# Altium footprint library Amirreza.PcbLib: 524 footprints (part 12 of 33)
Each footprint in its own frame and in the unit in brackets; x right, y up, seen from the top. Pads: shape width x height; smd on the part's side, far side on the other; paste and mask are expansions set on the pad; w line width, h text height; cw(c..) or ccw(c..) is an arc to the next point about the centre after c.
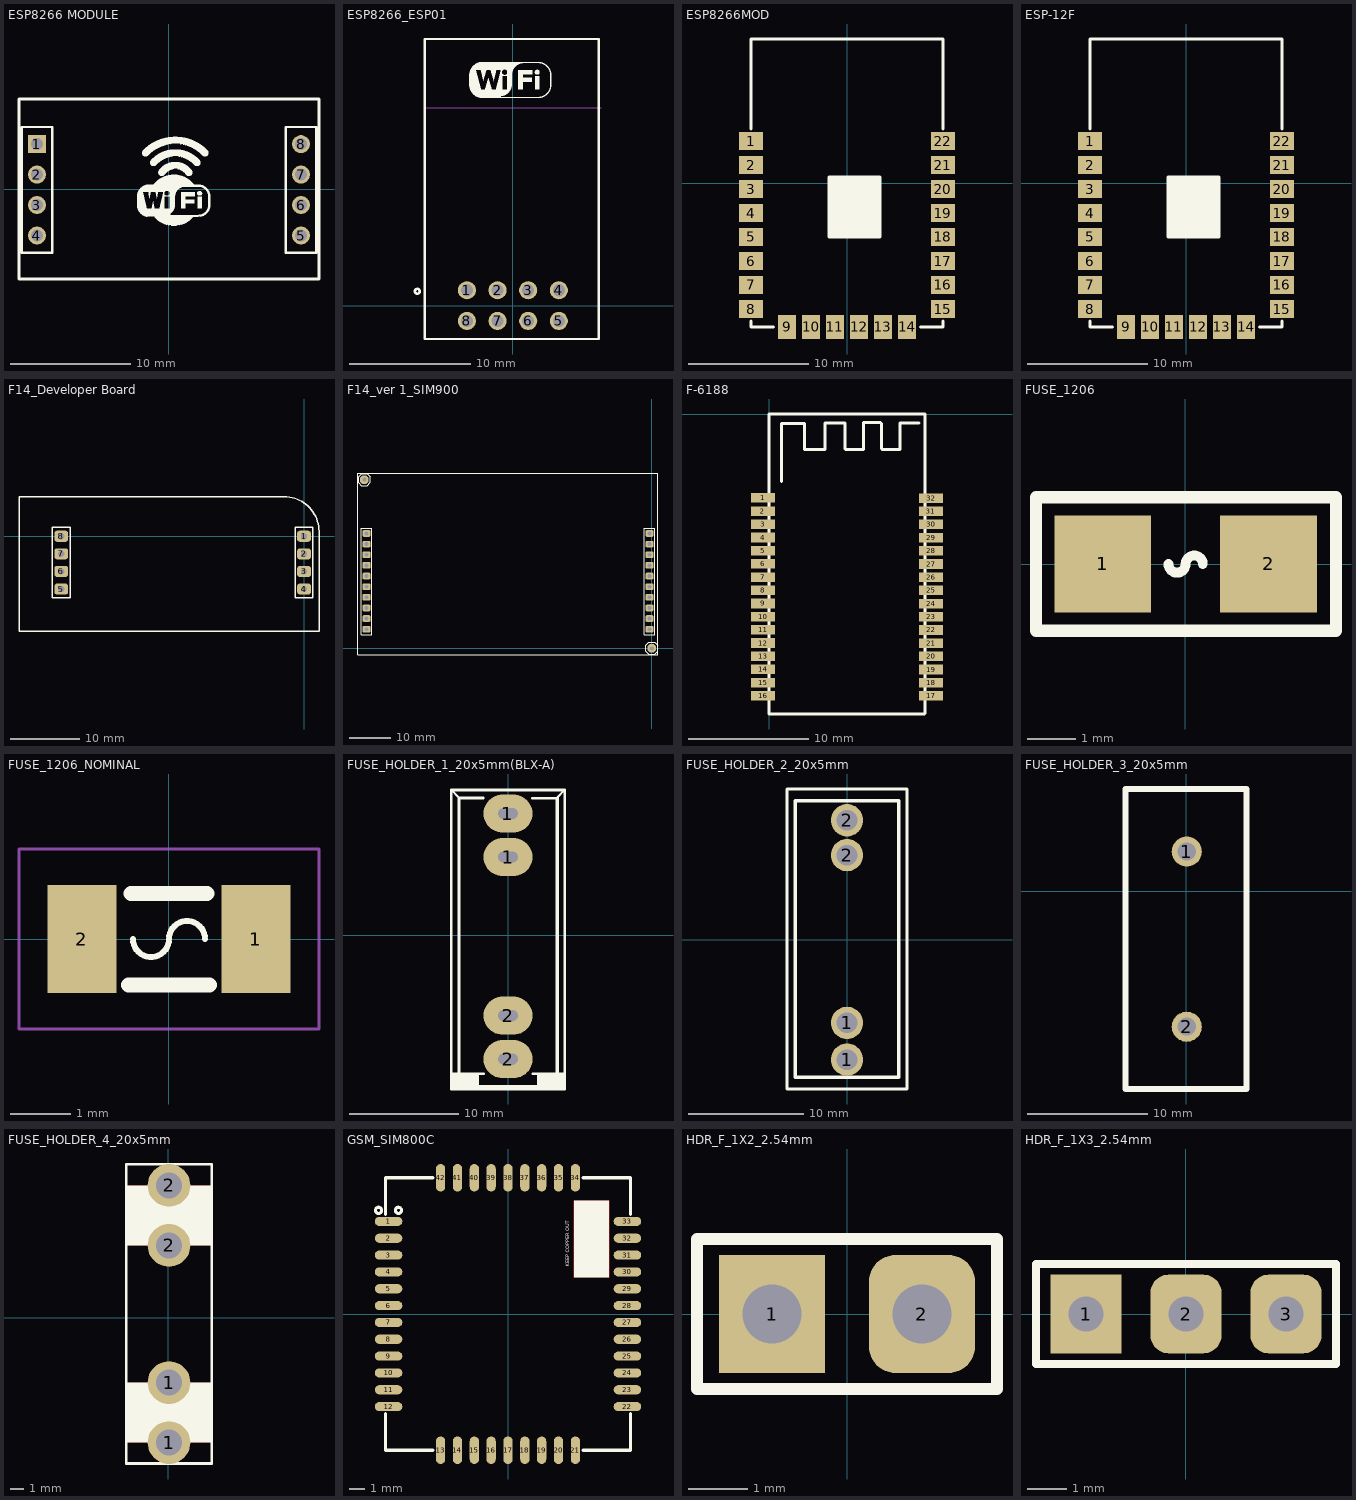
[diagram p11: the footprints below, top view; thin cyan lines are the x and y axes]

## ESP8266 MODULE [mm] "BasirAndishan.Co-Designe"
pads (8):
  rect 1.5x1.5 / inner rect 1.5x1.5 / far side rect 2.1x2.1 hole 1: 1(-10.997,3.75)
  round 1.5 / inner round 1.5 / far side round 2.1 hole 1: 2(-10.997,1.21) 3(-10.997,-1.33) 4(-10.997,-3.87) 5(11.003,-3.87) 6(11.003,-1.33) 7(11.003,1.21) 8(11.003,3.75)
Top Overlay:
  drawing of 20 lines, arcs and shapes, not listed
3D body "User Library-zl262-4s_p2-54_l10-66_w2-54_h8-5.step": height 8.55, standoff -2.95, extent -12.267,-5.39 -9.727,5.27
3D body "User Library-zl262-4s_p2-54_l10-66_w2-54_h8-5.step": height 8.55, standoff -2.95, extent 9.733,-5.39 12.273,5.27

## ESP8266_ESP01 [mm] "ESP8266 ESP-01_Ai-Thinker.Co"
pads (8):
  round 1.5 / inner round 1.5 / far side rect 2x2 hole 1: 1(-3.81,1.27)
  round 1.5 / inner round 1.5 / far side round 2 hole 1: 2(-1.27,1.27) 3(1.27,1.27) 4(3.81,1.27) 5(3.81,-1.27) 6(1.27,-1.27) 7(-1.27,-1.27) 8(-3.81,-1.27)
Top Overlay:
  drawing of 9 lines, arcs and shapes, not listed
Mechanical 13:
  lines w0.051: -7.289,16.406 7.315,16.406
3D body "User Library-Wi07C.STEP": height 5.8, standoff -5.88, extent -7.261,-2.749 7.239,22.051

## ESP8266MOD [mm]
pads (22):
  rect 2x1.5 smd: 1(-8,3.5) 2(-8,1.5) 3(-8,-0.5) 4(-8,-2.5) 5(-8,-4.5) 6(-8,-6.5) 7(-8,-8.5) 8(-8,-10.5) 15(8,-10.5) 16(8,-8.5) 17(8,-6.5) 18(8,-4.5) 19(8,-2.5) 20(8,-0.5) 21(8,1.5) 22(8,3.5)
  rect 1.5x2 smd: 9(-5,-12) 10(-3,-12) 11(-1,-12) 12(1,-12) 13(3,-12) 14(5,-12)
Top Overlay:
  region: 2.75,0.5 -1.5,0.5 -1.5,-4.5 2.75,-4.5
  lines w0.254: -8,-11.492 -8,-12 -6.111,-12 ; -8,4.51 -8,12 8,12 8,4.51 ; 6.111,-12 8,-12 8,-11.492 ; -1.5,-4.5 2.75,-4.5 2.75,0.5 -1.5,0.5 -1.5,-4.5
3D body "User Library-ESP_12_E.STEP": height 2.75, standoff 0.04, extent -8,-12 8,12

## ESP-12F [mm]
pads (22):
  rect 2x1.5 smd: 1(-8,3.5) 2(-8,1.5) 3(-8,-0.5) 4(-8,-2.5) 5(-8,-4.5) 6(-8,-6.5) 7(-8,-8.5) 8(-8,-10.5) 15(8,-10.5) 16(8,-8.5) 17(8,-6.5) 18(8,-4.5) 19(8,-2.5) 20(8,-0.5) 21(8,1.5) 22(8,3.5)
  rect 1.5x2 smd: 9(-5,-12) 10(-3,-12) 11(-1,-12) 12(1,-12) 13(3,-12) 14(5,-12)
Top Overlay:
  region: 2.75,0.5 -1.5,0.5 -1.5,-4.5 2.75,-4.5
  lines w0.254: -8,-11.492 -8,-12 -6.111,-12 ; -8,4.51 -8,12 8,12 8,4.51 ; 6.111,-12 8,-12 8,-11.492 ; -1.5,-4.5 2.75,-4.5 2.75,0.5 -1.5,0.5 -1.5,-4.5
3D body "User Library-ESP_12_E.STEP": height 2.75, standoff 0.04, extent -8,-12 8,12

## F14_Developer Board [mm]
pads (8):
  rrect50% 2x1.6 hole 0.9: 1(0,0) 2(0,-2.54) 3(0,-5.08) 4(0,-7.62) 5(-35.052,-7.62) 6(-35.052,-5.08) 7(-35.052,-2.54) 8(-35.052,0)
Top Overlay:
  lines w0.2: -41.148,-13.716 2.158,-13.716 2.158,0.703 ccw(c-2.842,0.703) -2.842,5.703 -41.148,5.703 -41.148,-13.716 ; -36.322,-8.89 -36.322,1.27 -33.782,1.27 -33.782,-8.89 -36.322,-8.89 ; -1.27,-8.89 -1.27,1.27 1.27,1.27 1.27,-8.89 -1.27,-8.89

## F14_ver 1_SIM900 [mm]
pads (22):
  rrect50% 2x1.6 hole 0.9: 1(-0.558,27.432) 2(-0.558,24.892) 3(-0.558,22.352) 4(-0.558,19.812) 5(-0.558,17.272) 6(-0.558,14.732) 7(-0.558,12.192) 8(-0.558,9.652) 9(-0.558,7.112) 10(-0.558,4.572) 11(-68.122,4.572) 12(-68.122,7.112) 13(-68.122,9.652) 14(-68.122,12.192) 15(-68.122,14.732) 16(-68.122,17.272) 17(-68.122,19.812) 18(-68.122,22.352) 19(-68.122,24.892) 20(-68.122,27.432)
  oct 2x2 hole 1: 10(-68.63,40.284) 10(0,0)
Top Overlay:
  lines w0.2: -70.03,39.58 -69.334,38.884 -67.974,38.884 -67.23,39.628 -67.23,40.98 -67.934,41.684 -69.315,41.684 -70.03,40.969 -70.03,39.58 ; -69.392,3.302 -66.852,3.302 -66.852,26.797 -66.852,28.702 -69.392,28.702 -69.392,3.302 ; -1.828,3.302 0.712,3.302 0.712,26.797 0.712,28.702 -1.828,28.702 -1.828,3.302 ; -1.4,-0.704 -0.704,-1.4 0.656,-1.4 1.4,-0.656 1.4,0.696 0.696,1.4 -0.685,1.4 -1.4,0.685 -1.4,-0.704
  lines w0.279: -70.154,-1.524 1.474,-1.524 1.474,41.808 -70.154,41.808 -70.154,-1.524
Bottom Overlay:
  lines w0.2: -70.03,39.588 -69.326,38.884 -67.974,38.884 -67.23,39.628 -67.23,40.988 -67.926,41.684 -69.315,41.684 -70.03,40.969 -70.03,39.588 ; -1.4,-0.696 -0.696,-1.4 0.656,-1.4 1.4,-0.656 1.4,0.704 0.704,1.4 -0.685,1.4 -1.4,0.685 -1.4,-0.696

## F-6188 [mm]
pads (32):
  rect 2x0.8 smd: 1(-0.5,-7) 2(-0.508,-8.1) 3(-0.5,-9.2) 4(-0.5,-10.3) 5(-0.5,-11.4) 6(-0.5,-12.5) 7(-0.5,-13.6) 8(-0.5,-14.7) 9(-0.5,-15.8) 10(-0.5,-16.9) 11(-0.5,-18) 12(-0.5,-19.1) 13(-0.5,-20.2) 14(-0.5,-21.3) 15(-0.5,-22.4) 16(-0.5,-23.5) 17(13.513,-23.51) 18(13.513,-22.41) 19(13.513,-21.31) 20(13.513,-20.21) 21(13.513,-19.11) 22(13.513,-18.01) 23(13.513,-16.91) 24(13.513,-15.81) 25(13.513,-14.71) 26(13.513,-13.61) 27(13.513,-12.51) 28(13.513,-11.41) 29(13.513,-10.31) 30(13.513,-9.21) 31(13.505,-8.11) 32(13.513,-7.01)
Top Overlay:
  lines w0.254: 1.041,-5.639 1.041,-0.787 2.972,-0.787 2.972,-2.946 4.674,-2.946 4.674,-0.762 6.35,-0.762 6.35,-2.921 6.375,-2.946 7.874,-2.946 7.874,-0.711 9.296,-0.711 9.373,-0.787 9.373,-2.896 9.423,-2.946 10.922,-2.946 10.922,-0.737 12.497,-0.737 ; 12.979,-25.019 0,-25.019 0,0 13.005,0 13.005,-24.994

## FUSE_1206 [mm]
pads (2):
  rect 2x2 smd: 1(-1.705,0.001) 2(1.724,0.001)
Top Overlay:
  lines w0.203: -0.347,0 ccw(c-0.169,0) 0.009,0 cw(c0.187,0) 0.365,0
  lines w0.254: -3.086,-1.38 -3.086,1.382 3.119,1.382 3.119,-1.38 -3.086,-1.38
3D body "User Library-0ZCJ0035FF2G.step": height 0.81, standoff 0.01, extent -1.691,-0.849 1.709,0.851

## FUSE_1206_NOMINAL [mm]
pads (2):
  rect 1.15x1.8 smd: 1(1.45,0) 2(-1.45,0)
Top Overlay:
  lines w0.1: -0.598,0.001 ccw(c-0.298,0.001) 0.002,0.001 cw(c0.302,0.001) 0.602,0.001
  lines w0.25: -0.673,-0.762 0.673,-0.762 ; -0.635,0.762 0.635,0.762
Mechanical 13:
  lines w0.05: -2.498,-1.499 -2.498,1.501 2.502,1.501 2.502,-1.499 -2.498,-1.499
3D body "User Library-0ZCJ0035FF2G.step": height 0.81, standoff 0.01, extent -1.698,-0.849 1.702,0.851

## FUSE_HOLDER_1_20x5mm(BLX-A) [mm]
pads (4):
  oval 4.5x3.5 hole 1 slot 1.8 at 0 deg: 1(-0.002,11.166) 1(0.002,7.181) 2(0.002,-7.348) 2(0.006,-11.334)
Top Overlay:
  rectangle: -2.921,-14.072 2.794,-13.716
  region: -2.667,-12.55 -5.207,-12.55 -5.207,-13.97 -2.667,-13.97
  rectangle: 2.663,-13.97 5.203,-12.55
  lines w0.203: -5.207,13.335 -4.445,12.573 ; 4.441,12.573 5.203,13.335
  lines w0.254: -4.498,12.582 -2.261,12.582 ; -4.48,-12.665 -2.243,-12.665 ; 2.247,12.573 4.485,12.573 ; 2.265,-12.674 4.502,-12.674 ; -5.198,-14.072 -5.198,13.335 5.202,13.335 5.202,-14.072 -5.198,-14.072
  lines w0.3: -4.498,-12.7 -4.498,12.573 ; 4.502,-12.7 4.502,12.573
3D body "User Library-BLX-A Fuse Holder.step": height 13.07, standoff -4, extent -4.8,-13.8 4.8,13.378

## FUSE_HOLDER_2_20x5mm [mm]
pads (4):
  round 2.8 hole 1.8: 1(-0.002,-7.181) 1(0.002,-10.375) 2(-0.002,7.348) 2(0.002,10.375)
Top Overlay:
  lines w0.254: -5.202,-12.916 5.198,-12.916 5.198,13.084 -5.202,13.084 -5.202,-12.916
  lines w0.3: -4.502,-11.916 4.498,-11.916 4.498,12.084 -4.502,12.084 -4.502,-11.916
3D body "User Library-Fuse_Holder_FH-101-1.STEP": height 10.8, standoff -4.2, extent -4.8,-12.15 4.8,12.15

## FUSE_HOLDER_3_20x5mm [mm]
pads (2):
  round 2.5 hole 1.5: 1(0.039,3.314) 2(0.039,-11.215)
Top Overlay:
  lines w0.5: -5.041,-12.79 -5.041,8.5 4.992,8.5 4.992,-12.79 ; -5.041,-12.155 -5.041,-16.383 4.992,-16.383 4.992,-12.155

## FUSE_HOLDER_4_20x5mm [mil]
pads (4):
  round 125 hole 75: 1(2,-364) 1(2,-189) 2(2,211) 2(2,386)
Top Layer:
  rectangle: -123,-364 127,-189
  rectangle: -123,211 127,386
Top Overlay:
  rectangle: -123,-364 127,-189
  rectangle: -123,211 127,386
  lines w8: -123,-425 -123,448 127,448 127,-425 -123,-425
3D body "User Library-portefusible.STEP": height 452.76, standoff -123.18, extent -188.98,-500.82 188.97,501.04

## GSM_SIM800C [mm] "GSM, SIM800C, 42-L, 15.7X17.6mm"
pads (42):
  oval 1.8x0.6 smd: 1(-7.8,6.05) 2(-7.8,4.95) 3(-7.8,3.85) 4(-7.8,2.75) 5(-7.8,1.65) 6(-7.8,0.55) 7(-7.8,-0.55) 8(-7.8,-1.65) 9(-7.8,-2.75) 10(-7.8,-3.85) 11(-7.8,-4.95) 12(-7.8,-6.05) 22(7.8,-6.05) 23(7.8,-4.95) 24(7.8,-3.85) 25(7.8,-2.75) 26(7.8,-1.65) 27(7.8,-0.55) 28(7.8,0.55) 29(7.8,1.65) 30(7.8,2.75) 31(7.8,3.85) 32(7.8,4.95) 33(7.8,6.05)
  oval 0.6x1.8 smd: 13(-4.4,-8.9) 14(-3.3,-8.9) 15(-2.2,-8.9) 16(-1.1,-8.9) 17(0,-8.9) 18(1.1,-8.9) 19(2.2,-8.9) 20(3.3,-8.9) 21(4.4,-8.9) 34(4.4,8.9) 35(3.3,8.9) 36(2.2,8.9) 37(1.1,8.9) 38(0,8.9) 39(-1.1,8.9) 40(-2.2,8.9) 41(-3.3,8.9) 42(-4.4,8.9)
Top Layer:
  pour cut-out: 6.6,7.4 4.3,7.4 4.3,2.4 6.6,2.4
Top Overlay:
  circle w0.2: c-7.155,6.774 r0.2
  circle w0.2: c-8.455,6.774 r0.2
  rectangle: 4.3,2.4 6.6,7.4
  lines w0.2: -8,-6.5 -8,-8.9 -4.9,-8.9 ; -8,6.5 -8,8.9 -4.9,8.9 ; 4.9,-8.9 8,-8.9 8,-6.5 ; 4.9,8.9 8,8.9 8,6.5
  text "KEEP COPPER OUT" at 4.1,3.1 h0.4
3D body "SIM800C-1.STEP": height 2.37, standoff 0.03, extent -7.849,-8.812 7.851,8.788

## HDR_F_1X2_2.54mm [mm]
pads (2):
  rect 1.8x2 hole 1: 1(-1.27,0)
  rrect50% 1.8x2 hole 1: 2(1.27,0)
Top Overlay:
  lines w0.2: -2.54,-1.27 -2.54,1.27 2.54,1.27 2.54,-1.27 -2.54,-1.27
3D body "User Library-HeaderRangLuocDonThang2_54mm.step": height 8.5, standoff -3.2, extent -2.54,-1.27 2.54,1.27

## HDR_F_1X3_2.54mm [mm]
pads (3):
  rect 1.8x2 hole 0.9: 1(-2.54,0)
  rrect50% 1.8x2 hole 0.9: 2(0,0) 3(2.54,0)
Top Overlay:
  lines w0.2: -3.81,-1.27 3.81,-1.27 3.81,1.27 -3.81,1.27 -3.81,-1.27
3D body "User Library-ZL262-3SG.step": height 8.4, standoff -3.15, extent -3.835,-1.25 3.785,1.25